# Altium footprint library Connectors.PcbLib: 79 footprints (part 4 of 5)
Each footprint in its own frame and in the unit in brackets; x right, y up, seen from the top. Pads: shape width x height; smd on the part's side, far side on the other; paste and mask are expansions set on the pad; w line width, h text height; cw(c..) or ccw(c..) is an arc to the next point about the centre after c.
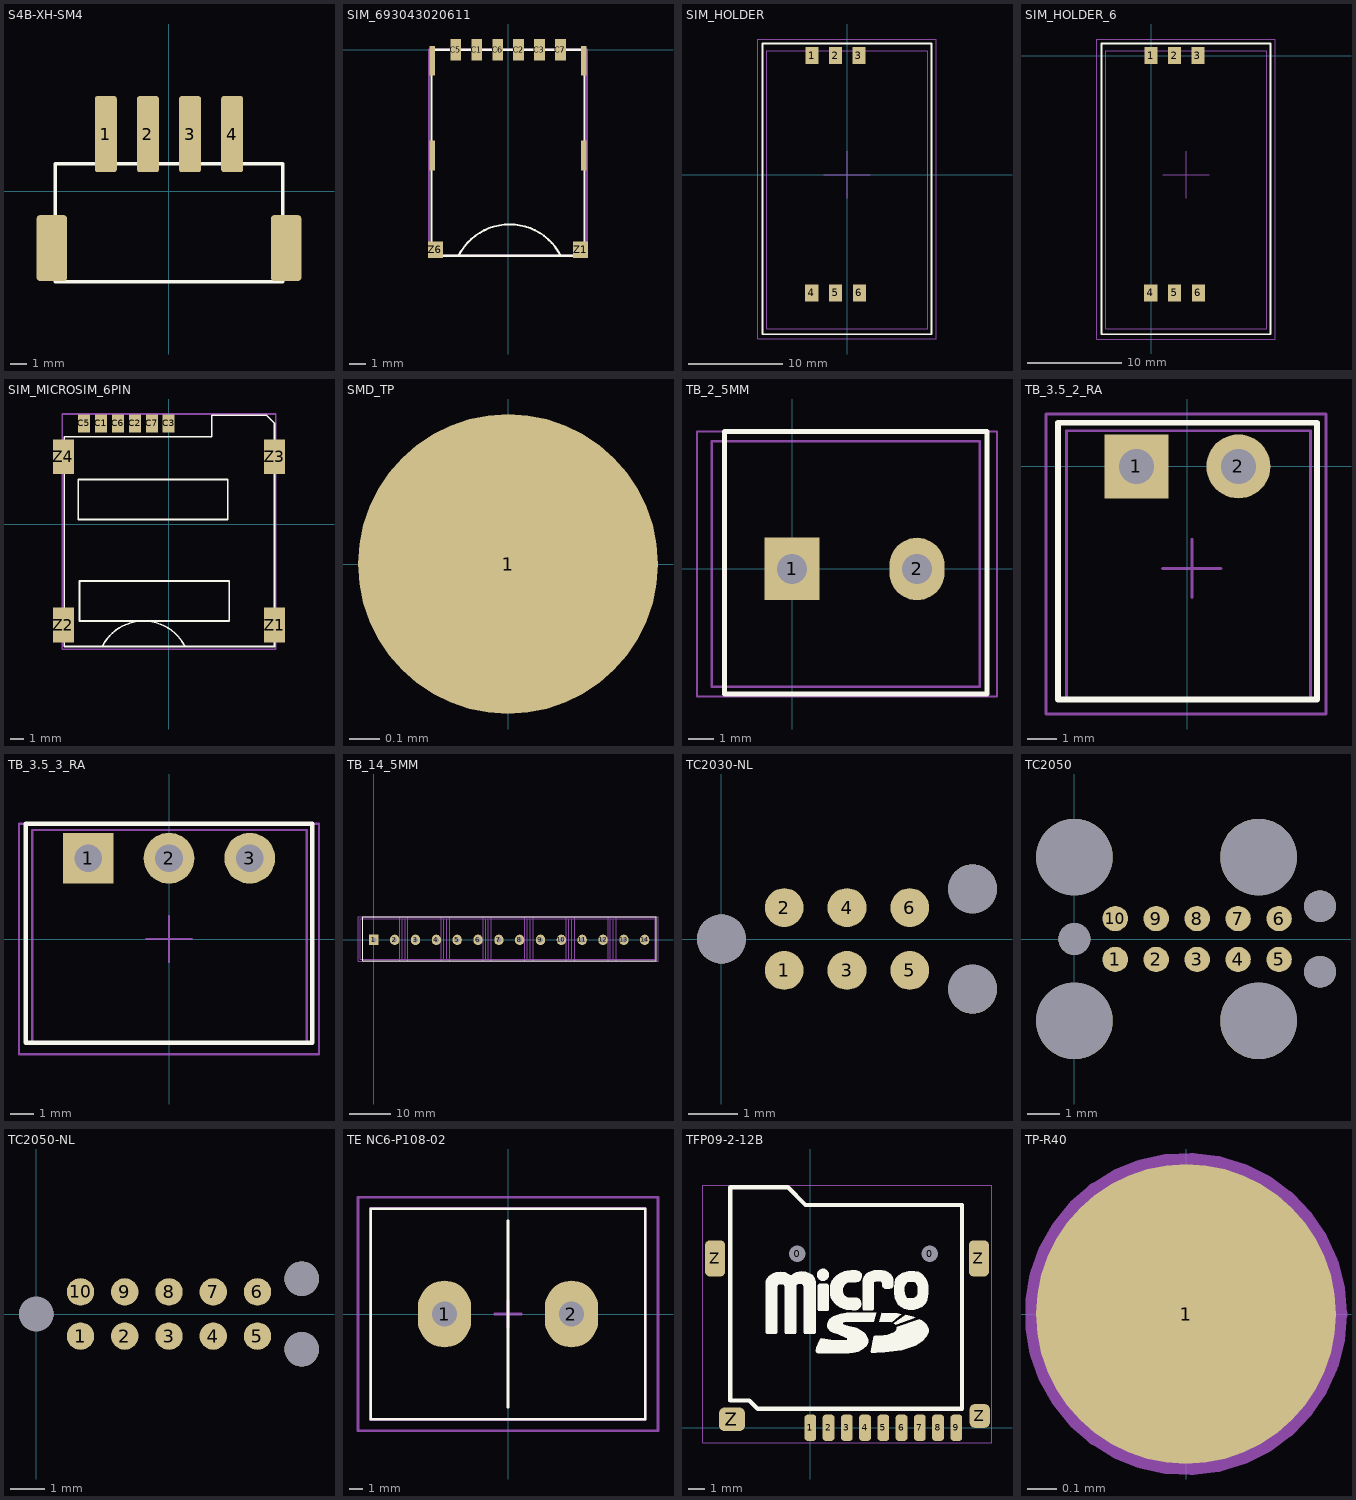
[diagram p3: the footprints below, top view; thin cyan lines are the x and y axes]

## S4B-XH-SM4 [mm]
pads (6):
  rrect20% 1.3x4.5 smd: 1(-3.75,3.38) 2(-1.25,3.38) 3(1.25,3.38) 4(3.75,3.38)
  rrect20% 1.8x3.9 smd: ""(-6.95,-3.38) ""(6.95,-3.38)
Top Overlay:
  lines w0.2: -6.75,-5.38 6.75,-5.38 6.75,1.62 -6.75,1.62 -6.75,-5.38
3D body "S4B-XH-SM4-TB.STEP": height 6, standoff 0, extent -7.475,-5.2 7.475,4.8

## SIM_693043020611 [mm]
pads (12):
  rect 0.65x1.3 smd: C1(-1.9,0) C2(0.64,0) C3(1.91,0) C5(-3.17,0) C6(-0.63,0) C7(3.18,0)
  rect 0.9x1 smd: Z1(4.4,-12.14) Z6(-4.4,-12.14)
  rect 0.35x1.8 smd: Z2(4.595,-6.42) Z3(4.595,-0.67) Z4(-4.596,-0.67) Z5(-4.596,-6.42)
Top Overlay:
  lines w0.127: -3,-12.5 cw(c0.1,-14.076) 3.2,-12.5 ; -4.65,-12.5 -4.65,0 4.65,0 4.65,-12.5 -4.65,-12.5
Mechanical 15:
  lines w0.127: -4.8,-12.5 4.8,-12.5 4.8,0 -4.8,0 -4.8,-12.5
3D body "693043020611.stp": height 1.2, standoff -0.01, extent -4.8,-12.5 4.8,0

## SIM_HOLDER [mm]
pads (6):
  rect 1.4x1.8 smd: 1(-3.725,12.725) 2(-1.225,12.725) 3(1.275,12.725) 4(-3.765,-12.575) 5(-1.225,-12.575) 6(1.315,-12.575)
Top Overlay:
  lines w0.2: -9,-17 -9,14 9,14 9,-17 -9,-17
Mechanical 13:
  lines w0.1: -8.575,-16.385 -8.575,13.255 8.625,13.255 8.625,-16.385 -8.575,-16.385
Mechanical 15:
  lines w0.05: -9.5,-17.5 -9.5,14.5 9.5,14.5 9.5,-17.5 -9.5,-17.5
  lines w0.1: -2.5,0 2.5,0 ; 0,-2.5 0,2.5
3D body "User Library-SIM5060-6-0-26-01-A.STEP": height 2.6, standoff -0.7, extent -8.575,-16.385 8.625,13.255

## SIM_HOLDER_6 [mm]
pads (6):
  rect 1.4x1.8 smd: 1(0,0) 2(2.5,0) 3(5,0) 4(-0.04,-25.3) 5(2.5,-25.3) 6(5.04,-25.3)
Top Overlay:
  lines w0.2: -5.275,-29.725 -5.275,1.275 12.725,1.275 12.725,-29.725 -5.275,-29.725
Mechanical 13:
  lines w0.1: -4.85,-29.11 -4.85,0.53 12.35,0.53 12.35,-29.11 -4.85,-29.11
Mechanical 15:
  lines w0.05: -5.775,-30.225 -5.775,1.775 13.225,1.775 13.225,-30.225 -5.775,-30.225
  lines w0.1: 1.225,-12.725 6.225,-12.725 ; 3.725,-15.225 3.725,-10.225
3D body "User Library-SIM holder 115B-AAA0-R.step": height 2.35, standoff -0.7, extent -4.8,-29.15 12.4,0.55

## SIM_MICROSIM_6PIN [mm]
pads (10):
  rect 0.9x1.35 smd: C1(-5.1,7.55) C2(-2.56,7.55) C3(-0.02,7.55) C5(-6.37,7.55) C6(-3.83,7.55) C7(-1.29,7.55)
  rect 1.56x2.61 smd: Z1(7.9,-7.55) Z2(-7.9,-7.55) Z3(7.9,5.05) Z4(-7.9,5.05)
Top Overlay:
  lines w0.127: -5,-9.15 cw(c-1.9,-10.726) 1.2,-9.15 ; -7.85,-9.15 -7.85,6.55 3.2,6.55 3.2,8.15 7.3,8.15 7.9,7.55 7.9,6.55 7.9,-9.15 -7.85,-9.15 ; -6.8,0.35 4.4,0.35 4.4,3.35 -6.8,3.35 -6.8,0.35 ; -6.7,-7.25 -6.7,-4.25 4.5,-4.25 4.5,-7.25 -6.7,-7.25
Mechanical 15:
  lines w0.127: -8,-9.35 8,-9.35 8,8.25 -8,8.25 -8,-9.35
3D body "User Library-Sim Holder.step": height 1.35, standoff 0, extent -8.2,-9 8.2,8.2

## SMD_TP [mm] "Test point"
pads (1):
  round 1 smd: 1(0,0)

## TB_2_5MM [mm]
pads (2):
  rect 2.2x2.5 hole 1.2: 1(0,0)
  oval 2.2x2.5 hole 1.2: 2(5,0)
Top Overlay:
  lines w0.2: -2.7,-5 -2.7,5.5 7.8,5.5 7.8,-5 -2.7,-5
Mechanical 13:
  lines w0.1: -3.2,-4.7 7.5,-4.7 7.5,5.1 -3.2,5.1 -3.2,-4.7
Mechanical 15:
  lines w0.1: -3.8,-5.1 -3.8,5.5 8.2,5.5 8.2,-5.1 -3.8,-5.1
3D body "37752.stp": height 13.8, standoff -3.5, extent -3.17,-4.7 7.57,5.1

## TB_3.5_2_RA [mm]
pads (2):
  rect 2.2x2.2 hole 1.2: 1(-1.75,0)
  round 2.2 hole 1.2: 2(1.75,0)
Top Overlay:
  lines w0.2: -4.45,-8 4.45,-8 4.45,1.5 -4.45,1.5 -4.45,-8
Mechanical 13:
  lines w0.1: -4.15,-7.975 -4.15,1.225 4.225,1.225 4.225,-7.975 -4.15,-7.975
Mechanical 15:
  lines w0.1: -0.85,-3.5 1.15,-3.5 ; 0.15,-4.5 0.15,-2.5 ; -4.85,-8.5 4.75,-8.5 4.75,1.8 -4.85,1.8 -4.85,-8.5
3D body "User Library-15EDGRC-3_5-2.step": height 7.2, standoff -3.4, extent -3.9,-7.975 3.9,1.225

## TB_3.5_3_RA [mm]
pads (3):
  rect 2.2x2.2 hole 1.2: 1(-3.5,3.5)
  round 2.2 hole 1.2: 2(0,3.5) 3(3.5,3.5)
Top Overlay:
  lines w0.2: -6.2,-4.5 6.2,-4.5 6.2,5 -6.2,5 -6.2,-4.5
Mechanical 13:
  lines w0.1: -5.925,-4.475 -5.925,4.725 5.975,4.725 5.975,-4.475 -5.925,-4.475
Mechanical 15:
  lines w0.1: -1,0 1,0 ; 0,-1 0,1 ; -6.5,-5 6.5,-5 6.5,5 -6.5,5 -6.5,-5
3D body "User Library-15EDGRC-3_5-3.step": height 7.2, standoff -3.4, extent -5.625,-4.5 5.675,4.7

## TB_14_5MM [mm]
pads (14):
  rect 2.2x2.5 hole 1.2: 1(0,0)
  oval 2.2x2.5 hole 1.2: 2(5,0) 3(10,0) 4(15,0) 5(20,0) 6(25,0) 7(30,0) 8(35,0) 9(40,0) 10(45,0) 11(50,0) 12(55,0) 13(60,0) 14(65,0)
Top Overlay:
  lines w0.2: 7.3,-5 17.8,-5 ; 7.3,5.5 17.8,5.5 ; 7.8,-5 -2.7,-5 -2.7,5.5 7.8,5.5 ; 17.3,-5 27.8,-5 ; 17.3,5.5 27.8,5.5 ; 27.3,-5 37.8,-5 ; 27.3,5.5 37.8,5.5 ; 37.3,-5 47.8,-5 ; 37.3,5.5 47.8,5.5 ; 47.3,-5 57.8,-5 ; 47.3,5.5 57.8,5.5 ; 57.3,-5 67.8,-5 67.8,5.5 57.3,5.5
Mechanical 13:
  lines w0.1: -3.2,-4.7 -3.2,5.1 7.5,5.1 7.5,-4.7 -3.2,-4.7 ; 6.8,-4.7 17.5,-4.7 17.5,5.1 6.8,5.1 6.8,-4.7 ; 16.8,-4.7 16.8,5.1 27.5,5.1 27.5,-4.7 16.8,-4.7 ; 26.8,-4.7 26.8,5.1 37.5,5.1 37.5,-4.7 26.8,-4.7 ; 36.8,-4.7 36.8,5.1 47.5,5.1 47.5,-4.7 36.8,-4.7 ; 46.8,-4.7 46.8,5.1 57.5,5.1 57.5,-4.7 46.8,-4.7 ; 56.8,-4.7 56.8,5.1 67.5,5.1 67.5,-4.7 56.8,-4.7
Mechanical 15:
  lines w0.1: -3.8,-5.1 8.2,-5.1 8.2,5.5 -3.8,5.5 -3.8,-5.1 ; 6.2,-5.1 6.2,5.5 18.2,5.5 18.2,-5.1 6.2,-5.1 ; 16.2,-5.1 28.2,-5.1 28.2,5.5 16.2,5.5 16.2,-5.1 ; 26.2,-5.1 38.2,-5.1 38.2,5.5 26.2,5.5 26.2,-5.1 ; 36.2,-5.1 48.2,-5.1 48.2,5.5 36.2,5.5 36.2,-5.1 ; 46.2,-5.1 58.2,-5.1 58.2,5.5 46.2,5.5 46.2,-5.1 ; 56.2,-5.1 68.2,-5.1 68.2,5.5 56.2,5.5 56.2,-5.1
3D body "37752.stp": height 13.8, standoff -3.5, extent -3.17,-4.7 7.57,5.1
3D body "37752.stp": height 13.8, standoff -3.5, extent 6.83,-4.7 17.57,5.1
3D body "37752.stp": height 13.8, standoff -3.5, extent 16.83,-4.7 27.57,5.1
3D body "37752.stp": height 13.8, standoff -3.5, extent 26.83,-4.7 37.57,5.1
3D body "37752.stp": height 13.8, standoff -3.5, extent 36.83,-4.7 47.57,5.1
3D body "37752.stp": height 13.8, standoff -3.5, extent 46.83,-4.7 57.57,5.1
3D body "37752.stp": height 13.8, standoff -3.5, extent 56.83,-4.7 67.57,5.1

## TC2030-NL [mil]
pads (9):
  round 31 smd: 1(50,-25) 2(50,25) 3(100,-25) 4(100,25) 5(150,-25) 6(150,25)
  round 39 hole 39 unplated: ""(0,0) ""(200,-40) ""(200,40)

## TC2050 [mil]
pads (17):
  round 31 smd: 1(50,-25) 2(100,-25) 3(150,-25) 4(200,-25) 5(250,-25) 6(250,25) 7(200,25) 8(150,25) 9(100,25) 10(50,25)
  round 93.5 hole 93.5 unplated: ""(0,-100) ""(0,100) ""(225,-100) ""(225,100)
  round 39 hole 39 unplated: ""(0,0) ""(300,-39.96) ""(300,39.96)

## TC2050-NL [mil]
pads (13):
  round 31 smd: 1(50,-25) 2(100,-25) 3(150,-25) 4(200,-25) 5(250,-25) 6(250,25) 7(200,25) 8(150,25) 9(100,25) 10(50,25)
  round 39 hole 39 unplated: ""(0,0) ""(300,-39.96) ""(300,39.96)

## TE NC6-P108-02 [mm]
height 16.51
pads (2):
  oval 4x5 hole 1.854: 1(-4.763,0) 2(4.763,0)
Top Overlay:
  lines w0.2: 0,-7 0,7 ; -10.3,-7.9 -10.3,7.9 10.3,7.9 10.3,-7.9 -10.3,-7.9
Mechanical 1:
  lines w0.2: -10.312,-7.937 -10.312,7.938 10.287,7.938 10.287,-7.937 -10.312,-7.937
Mechanical 15:
  lines w0.2: -1,0 1,0 ; 0,-1 0,1 ; -11.25,-8.75 -11.25,8.75 11.25,8.75 11.25,-8.75 -11.25,-8.75
3D body "TE NC6-P108-02.STEP": height 16.38, standoff -4.57, extent -10.312,-7.937 10.287,7.938

## TFP09-2-12B [mil] "http://ali.pub/2rgdx8"
pads (15):
  round 30 hole 39.37 mask+0: 0(-31.5,413.39) 0(283.46,413.39)
  rrect50% 28x62 smd: 1(0,0) 2(43.31,0) 3(86.61,0) 4(129.92,0) 5(173.23,0) 6(216.54,0) 7(259.84,0) 8(303.15,0) 9(346.46,0)
  rrect50% 48x86 smd: Z(-226,402) Z(400,402)
  rrect50% 62x56 smd: Z(-186,20)
  rrect50% 48x56 smd: Z(402,28)
Top Overlay:
  drawing of 18 lines, arcs and shapes, not listed
Mechanical 14:
  lines w2: -255,-35 -255,575 430,575 430,-35 -255,-35
3D body "User Library-Micro SD.STEP": height 78.76, standoff -18.62, extent -230.25,-26.82 411.74,572

## TP-R40 [mil]
pads (1):
  round 40 smd paste-40: 1(0,0)
Mechanical 13:
  circle w3: c0,0 r20
3D body: height 10, standoff 0, extent -19.84,-19.96 20,19.96